# Altium footprint library Isolation.PcbLib: 8 footprints
Each footprint in its own frame and in the unit in brackets; x right, y up, seen from the top. Pads: shape width x height; smd on the part's side, far side on the other; paste and mask are expansions set on the pad; w line width, h text height; cw(c..) or ccw(c..) is an arc to the next point about the centre after c.
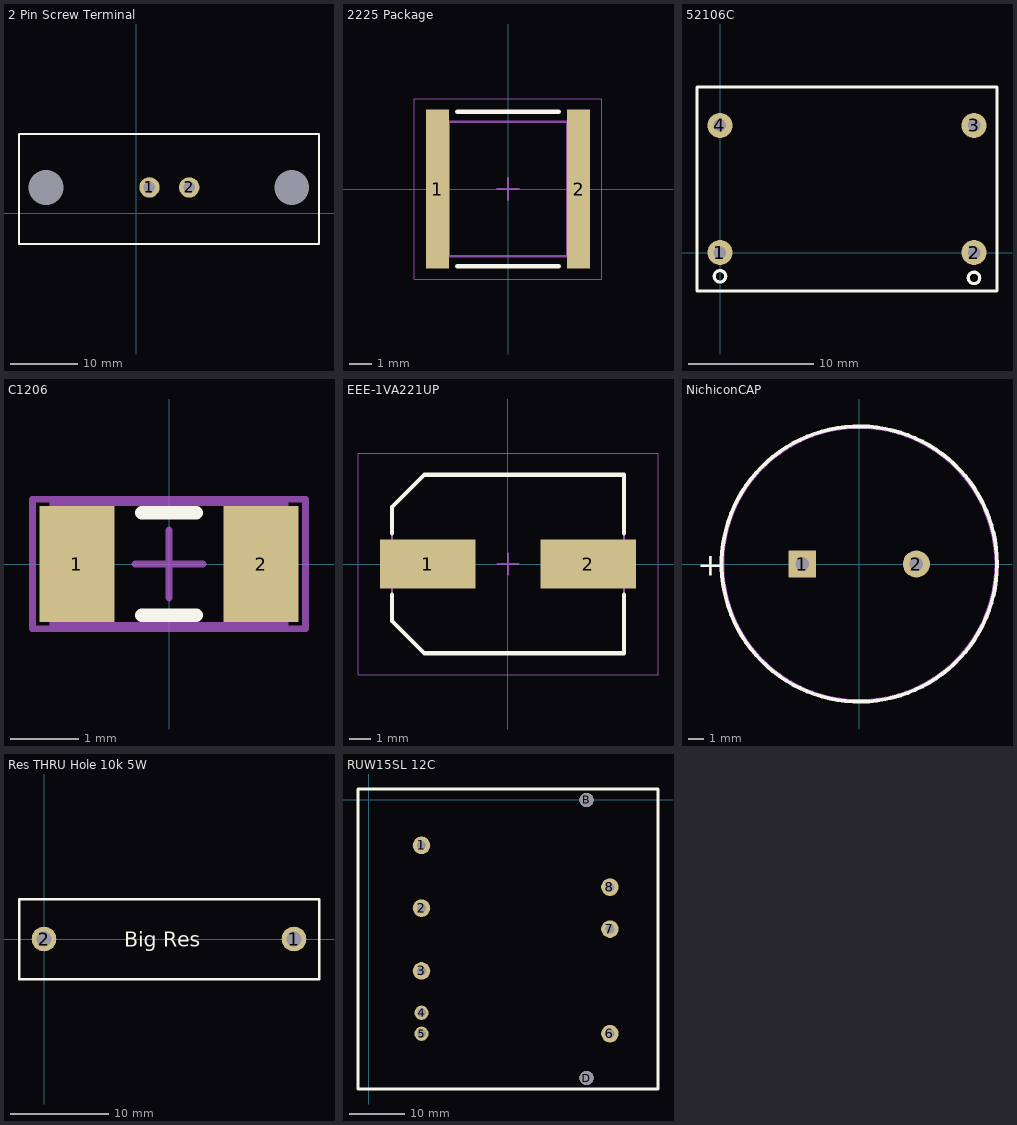
[diagram p0: the footprints below, top view; thin cyan lines are the x and y axes]

## 2 Pin Screw Terminal [mm]
pads (4):
  round 3 hole 1.7: 1(1.905,3.81) 2(7.747,3.81)
  round 0 hole 5.1: 3(-13.3,3.81) 3(22.84,3.81)
Top Overlay:
  lines w0.254: -17.28,-4.52 -17.28,11.68 26.84,11.68 26.84,-4.52 -17.28,-4.52
3D body "194270040.stp": height 29.9, standoff -3.29, extent -16.764,-3.937 26.416,35.725

## 2225 Package [mm]
pads (2):
  rect 1.05x7.2 smd: 1(-3.2,0) 2(3.2,0)
Top Overlay:
  lines w0.2: -2.3,-3.5 2.3,-3.5 ; -2.3,3.5 2.3,3.5
Mechanical 13:
  lines w0.1: -2.67,-3.05 2.67,-3.05 2.67,3.05 -2.67,3.05 -2.67,-3.05
Mechanical 15:
  lines w0.05: -4.25,-4.1 4.25,-4.1 4.25,4.1 -4.25,4.1 -4.25,-4.1
  lines w0.1: -0.5,0 0.5,0 ; 0,-0.5 0,0.5
3D body: height 2.18, standoff 0, extent 2.16,-3.05 2.67,3.05
3D body: height 2.18, standoff 0, extent -2.67,-3.05 -2.16,3.05
3D body: height 2.18, standoff 0, extent -2.16,-3.05 2.16,3.05

## 52106C [mm]
pads (4):
  round 2 hole 1: 1(0,0) 2(20.32,0) 3(20.32,10.16) 4(0,10.16)
Top Overlay:
  circle w0.254: c0,-1.905 r0.458
  circle w0.254: c20.32,-2.032 r0.458
  lines w0.254: -1.84,-3.07 -1.84,13.23 22.16,13.23 22.16,-3.07 -1.84,-3.07
3D body "mps_mag_52106C_thd_a.step": height 24.29, standoff -4.06, extent -1.834,-3.048 22.916,13.262

## C1206 [mm]
pads (2):
  rect 1.1x1.7 smd: 1(-1.35,0) 2(1.35,0)
Top Overlay:
  lines w0.2: -0.4,-0.75 0.4,-0.75 ; -0.4,0.75 0.4,0.75
Mechanical 13:
  lines w0.1: -1.7,-0.9 -1.7,0.9 1.7,0.9 1.7,-0.9 -1.7,-0.9
Mechanical 15:
  lines w0.1: -0.5,0 0.5,0 ; 0,-0.5 0,0.5 ; -2,-0.95 -2,0.95 2,0.95 2,-0.95 -2,-0.95
3D body: height 1.3, standoff 0, extent -1.7,-0.9 1.7,0.9

## EEE-1VA221UP [mm]
pads (2):
  rect 4.5x2.3 smd: 1(-3.775,0) 2(3.775,0)
Top Overlay:
  lines w0.2: -5.45,-1.45 -5.45,-2.675 -3.925,-4.2 5.45,-4.2 5.45,-1.45 ; -5.45,1.45 -5.45,2.675 -3.925,4.2 5.45,4.2 5.45,1.45
Mechanical 13:
  lines w0.1: -5.45,-2.675 -5.45,2.675 -3.925,4.2 5.45,4.2 5.45,-4.2 -3.925,-4.2 -5.45,-2.675
Mechanical 15:
  lines w0.05: -7.05,-5.2 7.05,-5.2 7.05,5.2 -7.05,5.2 -7.05,-5.2
  lines w0.1: -0.5,0 0.5,0 ; 0,-0.5 0,0.5
3D body "EEE-1VA221UP.stp": height 10.5, standoff 0, extent -5.005,-4.251 4.995,4.249

## NichiconCAP [mm]
pads (2):
  rect 1.778x1.778 hole 0.9: 1(-3.75,0)
  round 1.778 hole 0.9: 2(3.75,0)
Top Overlay:
  circle w0.254: c0,0 r9.05
  text "+" at -10.668,-0.762 h1.52
Mechanical 1:
  circle w0.254: c0,0 r9
3D body "ELCO-D16P7.5H25LD0.8.stp": height 25.02, standoff -3.6, extent -8,-8 8,8

## Res THRU Hole 10k 5W [mm]
pads (2):
  round 2.5 hole 1.5: 1(25.4,0) 2(0,0)
Top Overlay:
  lines w0.254: -2.54,-4.064 -2.54,0 -2.54,4.064 27.94,4.064 27.94,-4.064 -2.54,-4.064
  text "Big Res" at 8.128,-0.762 h1.52
3D body "AC05.stp": height 7.49, standoff -2.79, extent -0.025,-4.254 25.298,3.238

## RUW15SL 12C [mm]
pads (10):
  round 3.2 hole 1.6: 1(9.56,-8.25)
  round 3.2 / inner round 2.6 / far side round 3.2 hole 1.6: 2(9.56,-19.68) 3(9.56,-31.11) 6(43.85,-42.54) 7(43.85,-23.49) 8(43.85,-15.87)
  round 2.6 hole 1.6: 4(9.56,-38.73) 5(9.56,-42.54)
  round 2.6 hole 2.6 unplated: B(39.6,0) D(39.6,-50.6)
Top Overlay:
  lines w0.5: -2,-52.6 52.6,-52.6 52.6,2 -2,2 -2,-52.6
3D body "mps_dcdc_ruw15sl_a.STEP": height 21.31, standoff -3.81, extent 1.27,-50.937 52.07,-0.117